# Altium integrated library TI Power Management Battery Management.IntLib: 950 symbols (part 33 of 48) (continued)
## BQ24232RGTTG4 (continued)

## BQ24266RGER
designator U?
IC BATT CHARGER LI-ION 24VQFN; Manufacturer: Texas Instruments; Battery Chemistry: Lithium-Ion; Number of Cells: 1; Current - Charging: Constant - Programmable; Fault Protection: Over Temperature, Over Voltage; Charge Current - Max: 3A; Battery Pack Voltage: 4.2V; Voltage - Supply (Max): 14V; Interface: USB; Supplier 1: Digi-Key; Manufacturer Part Number: BQ24266RGER; RoHS: RoHS Compliant; Category: Integrated Circuits (ICs); Stock 1: 6527; Pricing 1: 1=4.3, 10=3.861, 100=3.1634, 500=2.69294, 1000=2.27115 (USD); Packaging: Cut Tape (CT); Part Status: Active; Programmable Features: -; Operating Temperature: -40°C ~ 85°C (TA); Package / Case: 24-VFQFN Exposed Pad; Supplier Device Package: 24-VQFN (4x4); Base Part Number: BQ24266; ComponentLink1URL: http://www.ti.com/lit/ds/symlink/bq24266.pdf; ComponentLink1Description: http://www.ti.com/lit/ds/symlink/bq24266.pdf; Value: BQ24266RGER; Supplier Part Number 1: 296-39923-1-ND
footprint 24VQFN_4x4 (QFN, 24-Leads, Body 4.00x4.00mm, Pitch 0.50mm, Thermal Pad 2.70x2.70mm, IPC Medium Density)
pins: 1 PMID, 2 BOOT (in), 3 DRV (out), 4 ~{CE} (in), 5 TS (in), 6 SYS (in), 7 SYS (in), 8 BAT, 9 BAT, 10 ~{PG} (out), 11 BGATE (out), 12 ISET (in), 13 ~{CHG} (out), 14 IUSB3 (in), 15 VDPM (in), 16 IUSB2 (in), 17 IUSB1 (in), 18 IN, 19 IN, 20 AGND, 21 PGND, 22 PGND, 23 SW, 24 SW, 25 EPAD

## BQ24300DSGR
designator U?
Charger Front End Protection IC with 30 V Max Vin and 5.5 V LDO Output, 0 to 125 degC, 8-pin WSON (DSG), Green (RoHS & no Sb/Br); PartNumber: BQ24300DSGR; Manufacturer: Texas Instruments; Lead Acid: N; DatasheetVersion: SLUS764C; PackageVersion: revB, Oct-2010; PackageReference: DSG8-1600X900TP; PackageDescription: 8-Pin Plastic Small Outline No-Lead, 2 x 2 x 0.8 mm Body, 0.5 mm Pitch, Exposed Pad; Supplier 1: Digi-Key; Supplier Part Number 1: 296-23075-2-ND; Supplier Part Number 3: 296-23075-6-ND; Eco-Plan: Green (RoHS & no Sb/Br); Li-Ion: N; Li-Polymer: N; NiCd: N; NiMH: N; Over Voltage Protection: N; SubFamily: Charger Front End Protection; Mounting Technology: Surface Mount; Code_JEDEC: MO-229; ComponentLink1Description: Datasheet; ComponentLink1URL: http://www.ti.com/general/docs/lit/getliterature.tsp?genericPartNumber=BQ24300&fileType=pdf
footprint DSG8-1600X900TP (SON, 8-Leads, Body 2x2mm, Pitch 0.5mm, Thermal Pad 1.6x0.9mm, TI Recommended)
pins: 1 IN (power) "Input power, connect to external DC supply. Connect external 0.1uF (minimum) ceramic capacitor to VSS", 2 VSS (power) "Ground terminal", 3 PGATE (out) "Gate drive for optional external P-FET", 4 NC "Do not connect to any external circuit. These pins may have internal connections used for test purposes.", 5 ~{CE} (in) "Chip enable input. Active low. When C\E\ = Hi, the input FET is off. Internally pulled down.", 6 VBAT (in) "Battery voltage sense input. Connect to pack positive terminal through a resistor.", 7 NC "Do not connect to any external circuit. These pins may have internal connections used for test purposes.", 8 OUT (power) "Output terminal to the charging system. Connect external 1uF capacitor (minimum) ceramic capacitor to VSS", 9 EP (power) "There is an internal electrical connection between the exposed thermal pad and the VSS pin of the device. The thermal pad must be connected to the same potential as the VSS pin on the printed circuit board. Do not use the (See Datasheet)"

## BQ24300DSGRG4
designator U?
Charger Front End Protection IC with 30 V Max Vin and 5.5 V LDO Output, 0 to 125 degC, 8-pin WSON (DSG), Green (RoHS & no Sb/Br); PartNumber: BQ24300DSGRG4; Manufacturer: Texas Instruments; Lead Acid: N; DatasheetVersion: SLUS764C; PackageVersion: revB, Oct-2010; PackageReference: DSG8-1600X900TP; PackageDescription: 8-Pin Plastic Small Outline No-Lead, 2 x 2 x 0.8 mm Body, 0.5 mm Pitch, Exposed Pad; Supplier 1: Digi-Key; Supplier Part Number 1: BQ24300DSGRG4-ND; Eco-Plan: Green (RoHS & no Sb/Br); Li-Ion: N; Li-Polymer: N; NiCd: N; NiMH: N; Over Voltage Protection: N; SubFamily: Charger Front End Protection; Mounting Technology: Surface Mount; Code_JEDEC: MO-229; ComponentLink1Description: Datasheet; ComponentLink1URL: http://www.ti.com/general/docs/lit/getliterature.tsp?genericPartNumber=BQ24300&fileType=pdf
footprint DSG8-1600X900TP (SON, 8-Leads, Body 2x2mm, Pitch 0.5mm, Thermal Pad 1.6x0.9mm, TI Recommended)
pins: 1 IN (power) "Input power, connect to external DC supply. Connect external 0.1uF (minimum) ceramic capacitor to VSS", 2 VSS (power) "Ground terminal", 3 PGATE (out) "Gate drive for optional external P-FET", 4 NC "Do not connect to any external circuit. These pins may have internal connections used for test purposes.", 5 ~{CE} (in) "Chip enable input. Active low. When C\E\ = Hi, the input FET is off. Internally pulled down.", 6 VBAT (in) "Battery voltage sense input. Connect to pack positive terminal through a resistor.", 7 NC "Do not connect to any external circuit. These pins may have internal connections used for test purposes.", 8 OUT (power) "Output terminal to the charging system. Connect external 1uF capacitor (minimum) ceramic capacitor to VSS", 9 EP (power) "There is an internal electrical connection between the exposed thermal pad and the VSS pin of the device. The thermal pad must be connected to the same potential as the VSS pin on the printed circuit board. Do not use the (See Datasheet)"

## BQ24300DSGT
designator U?
Charger Front End Protection IC with 30 V Max Vin and 5.5 V LDO Output, 0 to 125 degC, 8-pin WSON (DSG), Green (RoHS & no Sb/Br); PartNumber: BQ24300DSGT; Manufacturer: Texas Instruments; Lead Acid: N; DatasheetVersion: SLUS764C; PackageVersion: revB, Oct-2010; PackageReference: DSG8-1600X900TP; PackageDescription: 8-Pin Plastic Small Outline No-Lead, 2 x 2 x 0.8 mm Body, 0.5 mm Pitch, Exposed Pad; Supplier 1: Digi-Key; Supplier Part Number 1: BQ24300DSGT-ND; Eco-Plan: Green (RoHS & no Sb/Br); Li-Ion: N; Li-Polymer: N; NiCd: N; NiMH: N; Over Voltage Protection: N; SubFamily: Charger Front End Protection; Mounting Technology: Surface Mount; Code_JEDEC: MO-229; ComponentLink1Description: Datasheet; ComponentLink1URL: http://www.ti.com/general/docs/lit/getliterature.tsp?genericPartNumber=BQ24300&fileType=pdf
footprint DSG8-1600X900TP (SON, 8-Leads, Body 2x2mm, Pitch 0.5mm, Thermal Pad 1.6x0.9mm, TI Recommended)
pins: 1 IN (power) "Input power, connect to external DC supply. Connect external 0.1uF (minimum) ceramic capacitor to VSS", 2 VSS (power) "Ground terminal", 3 PGATE (out) "Gate drive for optional external P-FET", 4 NC "Do not connect to any external circuit. These pins may have internal connections used for test purposes.", 5 ~{CE} (in) "Chip enable input. Active low. When C\E\ = Hi, the input FET is off. Internally pulled down.", 6 VBAT (in) "Battery voltage sense input. Connect to pack positive terminal through a resistor.", 7 NC "Do not connect to any external circuit. These pins may have internal connections used for test purposes.", 8 OUT (power) "Output terminal to the charging system. Connect external 1uF capacitor (minimum) ceramic capacitor to VSS", 9 EP (power) "There is an internal electrical connection between the exposed thermal pad and the VSS pin of the device. The thermal pad must be connected to the same potential as the VSS pin on the printed circuit board. Do not use the (See Datasheet)"

## BQ24300DSGTG4
designator U?
Charger Front End Protection IC with 30 V Max Vin and 5.5 V LDO Output, 0 to 125 degC, 8-pin WSON (DSG), Green (RoHS & no Sb/Br); PartNumber: BQ24300DSGTG4; Manufacturer: Texas Instruments; Lead Acid: N; DatasheetVersion: SLUS764C; PackageVersion: revB, Oct-2010; PackageReference: DSG8-1600X900TP; PackageDescription: 8-Pin Plastic Small Outline No-Lead, 2 x 2 x 0.8 mm Body, 0.5 mm Pitch, Exposed Pad; Supplier 1: Digi-Key; Supplier Part Number 1: BQ24300DSGTG4-ND; Eco-Plan: Green (RoHS & no Sb/Br); Li-Ion: N; Li-Polymer: N; NiCd: N; NiMH: N; Over Voltage Protection: N; SubFamily: Charger Front End Protection; Mounting Technology: Surface Mount; Code_JEDEC: MO-229; ComponentLink1Description: Datasheet; ComponentLink1URL: http://www.ti.com/general/docs/lit/getliterature.tsp?genericPartNumber=BQ24300&fileType=pdf
footprint DSG8-1600X900TP (SON, 8-Leads, Body 2x2mm, Pitch 0.5mm, Thermal Pad 1.6x0.9mm, TI Recommended)
pins: 1 IN (power) "Input power, connect to external DC supply. Connect external 0.1uF (minimum) ceramic capacitor to VSS", 2 VSS (power) "Ground terminal", 3 PGATE (out) "Gate drive for optional external P-FET", 4 NC "Do not connect to any external circuit. These pins may have internal connections used for test purposes.", 5 ~{CE} (in) "Chip enable input. Active low. When C\E\ = Hi, the input FET is off. Internally pulled down.", 6 VBAT (in) "Battery voltage sense input. Connect to pack positive terminal through a resistor.", 7 NC "Do not connect to any external circuit. These pins may have internal connections used for test purposes.", 8 OUT (power) "Output terminal to the charging system. Connect external 1uF capacitor (minimum) ceramic capacitor to VSS", 9 EP (power) "There is an internal electrical connection between the exposed thermal pad and the VSS pin of the device. The thermal pad must be connected to the same potential as the VSS pin on the printed circuit board. Do not use the (See Datasheet)"

## BQ24304DSGR
designator U?
Charger Front End Protection IC with 30 V Max Vin and 4.5 V LDO Output, 0 to 125 degC, 8-pin WSON (DSG), Green (RoHS & no Sb/Br); PartNumber: BQ24304DSGR; Manufacturer: Texas Instruments; Lead Acid: N; DatasheetVersion: SLUS764C; PackageVersion: revB, Oct-2010; PackageReference: DSG8-1600X900TP; PackageDescription: 8-Pin Plastic Small Outline No-Lead, 2 x 2 x 0.8 mm Body, 0.5 mm Pitch, Exposed Pad; Supplier 1: Digi-Key; Supplier Part Number 1: 296-23076-2-ND; Supplier Part Number 3: 296-23076-6-ND; Eco-Plan: Green (RoHS & no Sb/Br); Li-Ion: N; Li-Polymer: N; NiCd: N; NiMH: N; Over Voltage Protection: N; SubFamily: Charger Front End Protection; Mounting Technology: Surface Mount; Code_JEDEC: MO-229; ComponentLink1Description: Datasheet; ComponentLink1URL: http://www.ti.com/general/docs/lit/getliterature.tsp?genericPartNumber=BQ24304&fileType=pdf
footprint DSG8-1600X900TP (SON, 8-Leads, Body 2x2mm, Pitch 0.5mm, Thermal Pad 1.6x0.9mm, TI Recommended)
pins: 1 IN (power) "Input power, connect to external DC supply. Connect external 0.1uF (minimum) ceramic capacitor to VSS", 2 VSS (power) "Ground terminal", 3 PGATE (out) "Gate drive for optional external P-FET", 4 NC "Do not connect to any external circuit. These pins may have internal connections used for test purposes.", 5 ~{CE} (in) "Chip enable input. Active low. When C\E\ = Hi, the input FET is off. Internally pulled down.", 6 VBAT (in) "Battery voltage sense input. Connect to pack positive terminal through a resistor.", 7 NC "Do not connect to any external circuit. These pins may have internal connections used for test purposes.", 8 OUT (power) "Output terminal to the charging system. Connect external 1uF capacitor (minimum) ceramic capacitor to VSS", 9 EP (power) "There is an internal electrical connection between the exposed thermal pad and the VSS pin of the device. The thermal pad must be connected to the same potential as the VSS pin on the printed circuit board. Do not use the (See Datasheet)"

## BQ24304DSGRG4
designator U?
Charger Front End Protection IC with 30 V Max Vin and 4.5 V LDO Output, 0 to 125 degC, 8-pin WSON (DSG), Green (RoHS & no Sb/Br); PartNumber: BQ24304DSGRG4; Manufacturer: Texas Instruments; Lead Acid: N; DatasheetVersion: SLUS764C; PackageVersion: revB, Oct-2010; PackageReference: DSG8-1600X900TP; PackageDescription: 8-Pin Plastic Small Outline No-Lead, 2 x 2 x 0.8 mm Body, 0.5 mm Pitch, Exposed Pad; Supplier 1: Digi-Key; Supplier Part Number 1: BQ24304DSGRG4-ND; Eco-Plan: Green (RoHS & no Sb/Br); Li-Ion: N; Li-Polymer: N; NiCd: N; NiMH: N; Over Voltage Protection: N; SubFamily: Charger Front End Protection; Mounting Technology: Surface Mount; Code_JEDEC: MO-229; ComponentLink1Description: Datasheet; ComponentLink1URL: http://www.ti.com/general/docs/lit/getliterature.tsp?genericPartNumber=BQ24304&fileType=pdf
footprint DSG8-1600X900TP (SON, 8-Leads, Body 2x2mm, Pitch 0.5mm, Thermal Pad 1.6x0.9mm, TI Recommended)
pins: 1 IN (power) "Input power, connect to external DC supply. Connect external 0.1uF (minimum) ceramic capacitor to VSS", 2 VSS (power) "Ground terminal", 3 PGATE (out) "Gate drive for optional external P-FET", 4 NC "Do not connect to any external circuit. These pins may have internal connections used for test purposes.", 5 ~{CE} (in) "Chip enable input. Active low. When C\E\ = Hi, the input FET is off. Internally pulled down.", 6 VBAT (in) "Battery voltage sense input. Connect to pack positive terminal through a resistor.", 7 NC "Do not connect to any external circuit. These pins may have internal connections used for test purposes.", 8 OUT (power) "Output terminal to the charging system. Connect external 1uF capacitor (minimum) ceramic capacitor to VSS", 9 EP (power) "There is an internal electrical connection between the exposed thermal pad and the VSS pin of the device. The thermal pad must be connected to the same potential as the VSS pin on the printed circuit board. Do not use the (See Datasheet)"

## BQ24304DSGT
designator U?
Charger Front End Protection IC with 30 V Max Vin and 4.5 V LDO Output, 0 to 125 degC, 8-pin WSON (DSG), Green (RoHS & no Sb/Br); PartNumber: BQ24304DSGT; Manufacturer: Texas Instruments; Lead Acid: N; DatasheetVersion: SLUS764C; PackageVersion: revB, Oct-2010; PackageReference: DSG8-1600X900TP; PackageDescription: 8-Pin Plastic Small Outline No-Lead, 2 x 2 x 0.8 mm Body, 0.5 mm Pitch, Exposed Pad; Supplier 1: Digi-Key; Supplier Part Number 1: BQ24304DSGT-ND; Eco-Plan: Green (RoHS & no Sb/Br); Li-Ion: N; Li-Polymer: N; NiCd: N; NiMH: N; Over Voltage Protection: N; SubFamily: Charger Front End Protection; Mounting Technology: Surface Mount; Code_JEDEC: MO-229; ComponentLink1Description: Datasheet; ComponentLink1URL: http://www.ti.com/general/docs/lit/getliterature.tsp?genericPartNumber=BQ24304&fileType=pdf
footprint DSG8-1600X900TP (SON, 8-Leads, Body 2x2mm, Pitch 0.5mm, Thermal Pad 1.6x0.9mm, TI Recommended)
pins: 1 IN (power) "Input power, connect to external DC supply. Connect external 0.1uF (minimum) ceramic capacitor to VSS", 2 VSS (power) "Ground terminal", 3 PGATE (out) "Gate drive for optional external P-FET", 4 NC "Do not connect to any external circuit. These pins may have internal connections used for test purposes.", 5 ~{CE} (in) "Chip enable input. Active low. When C\E\ = Hi, the input FET is off. Internally pulled down.", 6 VBAT (in) "Battery voltage sense input. Connect to pack positive terminal through a resistor.", 7 NC "Do not connect to any external circuit. These pins may have internal connections used for test purposes.", 8 OUT (power) "Output terminal to the charging system. Connect external 1uF capacitor (minimum) ceramic capacitor to VSS", 9 EP (power) "There is an internal electrical connection between the exposed thermal pad and the VSS pin of the device. The thermal pad must be connected to the same potential as the VSS pin on the printed circuit board. Do not use the (See Datasheet)"

## BQ24304DSGTG4
designator U?
Charger Front End Protection IC with 30 V Max Vin and 4.5 V LDO Output, 0 to 125 degC, 8-pin WSON (DSG), Green (RoHS & no Sb/Br); PartNumber: BQ24304DSGTG4; Manufacturer: Texas Instruments; Lead Acid: N; DatasheetVersion: SLUS764C; PackageVersion: revB, Oct-2010; PackageReference: DSG8-1600X900TP; PackageDescription: 8-Pin Plastic Small Outline No-Lead, 2 x 2 x 0.8 mm Body, 0.5 mm Pitch, Exposed Pad; Supplier 1: Digi-Key; Supplier Part Number 1: BQ24304DSGTG4-ND; Eco-Plan: Green (RoHS & no Sb/Br); Li-Ion: N; Li-Polymer: N; NiCd: N; NiMH: N; Over Voltage Protection: N; SubFamily: Charger Front End Protection; Mounting Technology: Surface Mount; Code_JEDEC: MO-229; ComponentLink1Description: Datasheet; ComponentLink1URL: http://www.ti.com/general/docs/lit/getliterature.tsp?genericPartNumber=BQ24304&fileType=pdf
footprint DSG8-1600X900TP (SON, 8-Leads, Body 2x2mm, Pitch 0.5mm, Thermal Pad 1.6x0.9mm, TI Recommended)
pins: 1 IN (power) "Input power, connect to external DC supply. Connect external 0.1uF (minimum) ceramic capacitor to VSS", 2 VSS (power) "Ground terminal", 3 PGATE (out) "Gate drive for optional external P-FET", 4 NC "Do not connect to any external circuit. These pins may have internal connections used for test purposes.", 5 ~{CE} (in) "Chip enable input. Active low. When C\E\ = Hi, the input FET is off. Internally pulled down.", 6 VBAT (in) "Battery voltage sense input. Connect to pack positive terminal through a resistor.", 7 NC "Do not connect to any external circuit. These pins may have internal connections used for test purposes.", 8 OUT (power) "Output terminal to the charging system. Connect external 1uF capacitor (minimum) ceramic capacitor to VSS", 9 EP (power) "There is an internal electrical connection between the exposed thermal pad and the VSS pin of the device. The thermal pad must be connected to the same potential as the VSS pin on the printed circuit board. Do not use the (See Datasheet)"

## BQ24305DSGR
designator U?
Overvoltage and Overcurrent Protection IC and Li+ Charger Front End Protection IC, 0 to 125 degC, 8-pin WSON (DSG), Green (RoHS & no Sb/Br); PartNumber: BQ24305DSGR; Manufacturer: Texas Instruments; Lead Acid: N; DatasheetVersion: SLUS764C; PackageVersion: revB, Oct-2010; PackageReference: DSG8-1600X900TP; PackageDescription: 8-Pin Plastic Small Outline No-Lead, 2 x 2 x 0.8 mm Body, 0.5 mm Pitch, Exposed Pad; Supplier 1: Digi-Key; Supplier Part Number 1: BQ24305DSGR-ND; Eco-Plan: Green (RoHS & no Sb/Br); Li-Ion: N; Li-Polymer: N; NiCd: N; NiMH: N; Over Voltage Protection: N; SubFamily: Charger Front End Protection; Mounting Technology: Surface Mount; Code_JEDEC: MO-229; ComponentLink1Description: Datasheet; ComponentLink1URL: http://www.ti.com/general/docs/lit/getliterature.tsp?genericPartNumber=BQ24305&fileType=pdf
footprint DSG8-1600X900TP (SON, 8-Leads, Body 2x2mm, Pitch 0.5mm, Thermal Pad 1.6x0.9mm, TI Recommended)
pins: 1 IN (power) "Input power, connect to external DC supply. Connect external 0.1uF (minimum) ceramic capacitor to VSS", 2 VSS (power) "Ground terminal", 3 PGATE (out) "Gate drive for optional external P-FET", 4 NC "Do not connect to any external circuit. These pins may have internal connections used for test purposes.", 5 ~{CE} (in) "Chip enable input. Active low. When C\E\ = Hi, the input FET is off. Internally pulled down.", 6 VBAT (in) "Battery voltage sense input. Connect to pack positive terminal through a resistor.", 7 NC "Do not connect to any external circuit. These pins may have internal connections used for test purposes.", 8 OUT (power) "Output terminal to the charging system. Connect external 1uF capacitor (minimum) ceramic capacitor to VSS", 9 EP (power) "There is an internal electrical connection between the exposed thermal pad and the VSS pin of the device. The thermal pad must be connected to the same potential as the VSS pin on the printed circuit board. Do not use the (See Datasheet)"

## BQ24305DSGRG4
designator U?
Overvoltage and Overcurrent Protection IC and Li+ Charger Front End Protection IC, 0 to 125 degC, 8-pin WSON (DSG), Green (RoHS & no Sb/Br); PartNumber: BQ24305DSGRG4; Manufacturer: Texas Instruments; Lead Acid: N; DatasheetVersion: SLUS764C; PackageVersion: revB, Oct-2010; PackageReference: DSG8-1600X900TP; PackageDescription: 8-Pin Plastic Small Outline No-Lead, 2 x 2 x 0.8 mm Body, 0.5 mm Pitch, Exposed Pad; Supplier 1: Digi-Key; Supplier Part Number 1: BQ24305DSGRG4-ND; Eco-Plan: Green (RoHS & no Sb/Br); Li-Ion: N; Li-Polymer: N; NiCd: N; NiMH: N; Over Voltage Protection: N; SubFamily: Charger Front End Protection; Mounting Technology: Surface Mount; Code_JEDEC: MO-229; ComponentLink1Description: Datasheet; ComponentLink1URL: http://www.ti.com/general/docs/lit/getliterature.tsp?genericPartNumber=BQ24305&fileType=pdf
footprint DSG8-1600X900TP (SON, 8-Leads, Body 2x2mm, Pitch 0.5mm, Thermal Pad 1.6x0.9mm, TI Recommended)
pins: 1 IN (power) "Input power, connect to external DC supply. Connect external 0.1uF (minimum) ceramic capacitor to VSS", 2 VSS (power) "Ground terminal", 3 PGATE (out) "Gate drive for optional external P-FET", 4 NC "Do not connect to any external circuit. These pins may have internal connections used for test purposes.", 5 ~{CE} (in) "Chip enable input. Active low. When C\E\ = Hi, the input FET is off. Internally pulled down.", 6 VBAT (in) "Battery voltage sense input. Connect to pack positive terminal through a resistor.", 7 NC "Do not connect to any external circuit. These pins may have internal connections used for test purposes.", 8 OUT (power) "Output terminal to the charging system. Connect external 1uF capacitor (minimum) ceramic capacitor to VSS", 9 EP (power) "There is an internal electrical connection between the exposed thermal pad and the VSS pin of the device. The thermal pad must be connected to the same potential as the VSS pin on the printed circuit board. Do not use the (See Datasheet)"

## BQ24305DSGT
designator U?
Overvoltage and Overcurrent Protection IC and Li+ Charger Front End Protection IC, 0 to 125 degC, 8-pin WSON (DSG), Green (RoHS & no Sb/Br); PartNumber: BQ24305DSGT; Manufacturer: Texas Instruments; Lead Acid: N; DatasheetVersion: SLUS764C; PackageVersion: revB, Oct-2010; PackageReference: DSG8-1600X900TP; PackageDescription: 8-Pin Plastic Small Outline No-Lead, 2 x 2 x 0.8 mm Body, 0.5 mm Pitch, Exposed Pad; Supplier 1: Digi-Key; Supplier Part Number 1: 296-23518-2-ND; Supplier Part Number 3: 296-23518-6-ND; Eco-Plan: Green (RoHS & no Sb/Br); Li-Ion: N; Li-Polymer: N; NiCd: N; NiMH: N; Over Voltage Protection: N; SubFamily: Charger Front End Protection; Mounting Technology: Surface Mount; Code_JEDEC: MO-229; ComponentLink1Description: Datasheet; ComponentLink1URL: http://www.ti.com/general/docs/lit/getliterature.tsp?genericPartNumber=BQ24305&fileType=pdf
footprint DSG8-1600X900TP (SON, 8-Leads, Body 2x2mm, Pitch 0.5mm, Thermal Pad 1.6x0.9mm, TI Recommended)
pins: 1 IN (power) "Input power, connect to external DC supply. Connect external 0.1uF (minimum) ceramic capacitor to VSS", 2 VSS (power) "Ground terminal", 3 PGATE (out) "Gate drive for optional external P-FET", 4 NC "Do not connect to any external circuit. These pins may have internal connections used for test purposes.", 5 ~{CE} (in) "Chip enable input. Active low. When C\E\ = Hi, the input FET is off. Internally pulled down.", 6 VBAT (in) "Battery voltage sense input. Connect to pack positive terminal through a resistor.", 7 NC "Do not connect to any external circuit. These pins may have internal connections used for test purposes.", 8 OUT (power) "Output terminal to the charging system. Connect external 1uF capacitor (minimum) ceramic capacitor to VSS", 9 EP (power) "There is an internal electrical connection between the exposed thermal pad and the VSS pin of the device. The thermal pad must be connected to the same potential as the VSS pin on the printed circuit board. Do not use the (See Datasheet)"

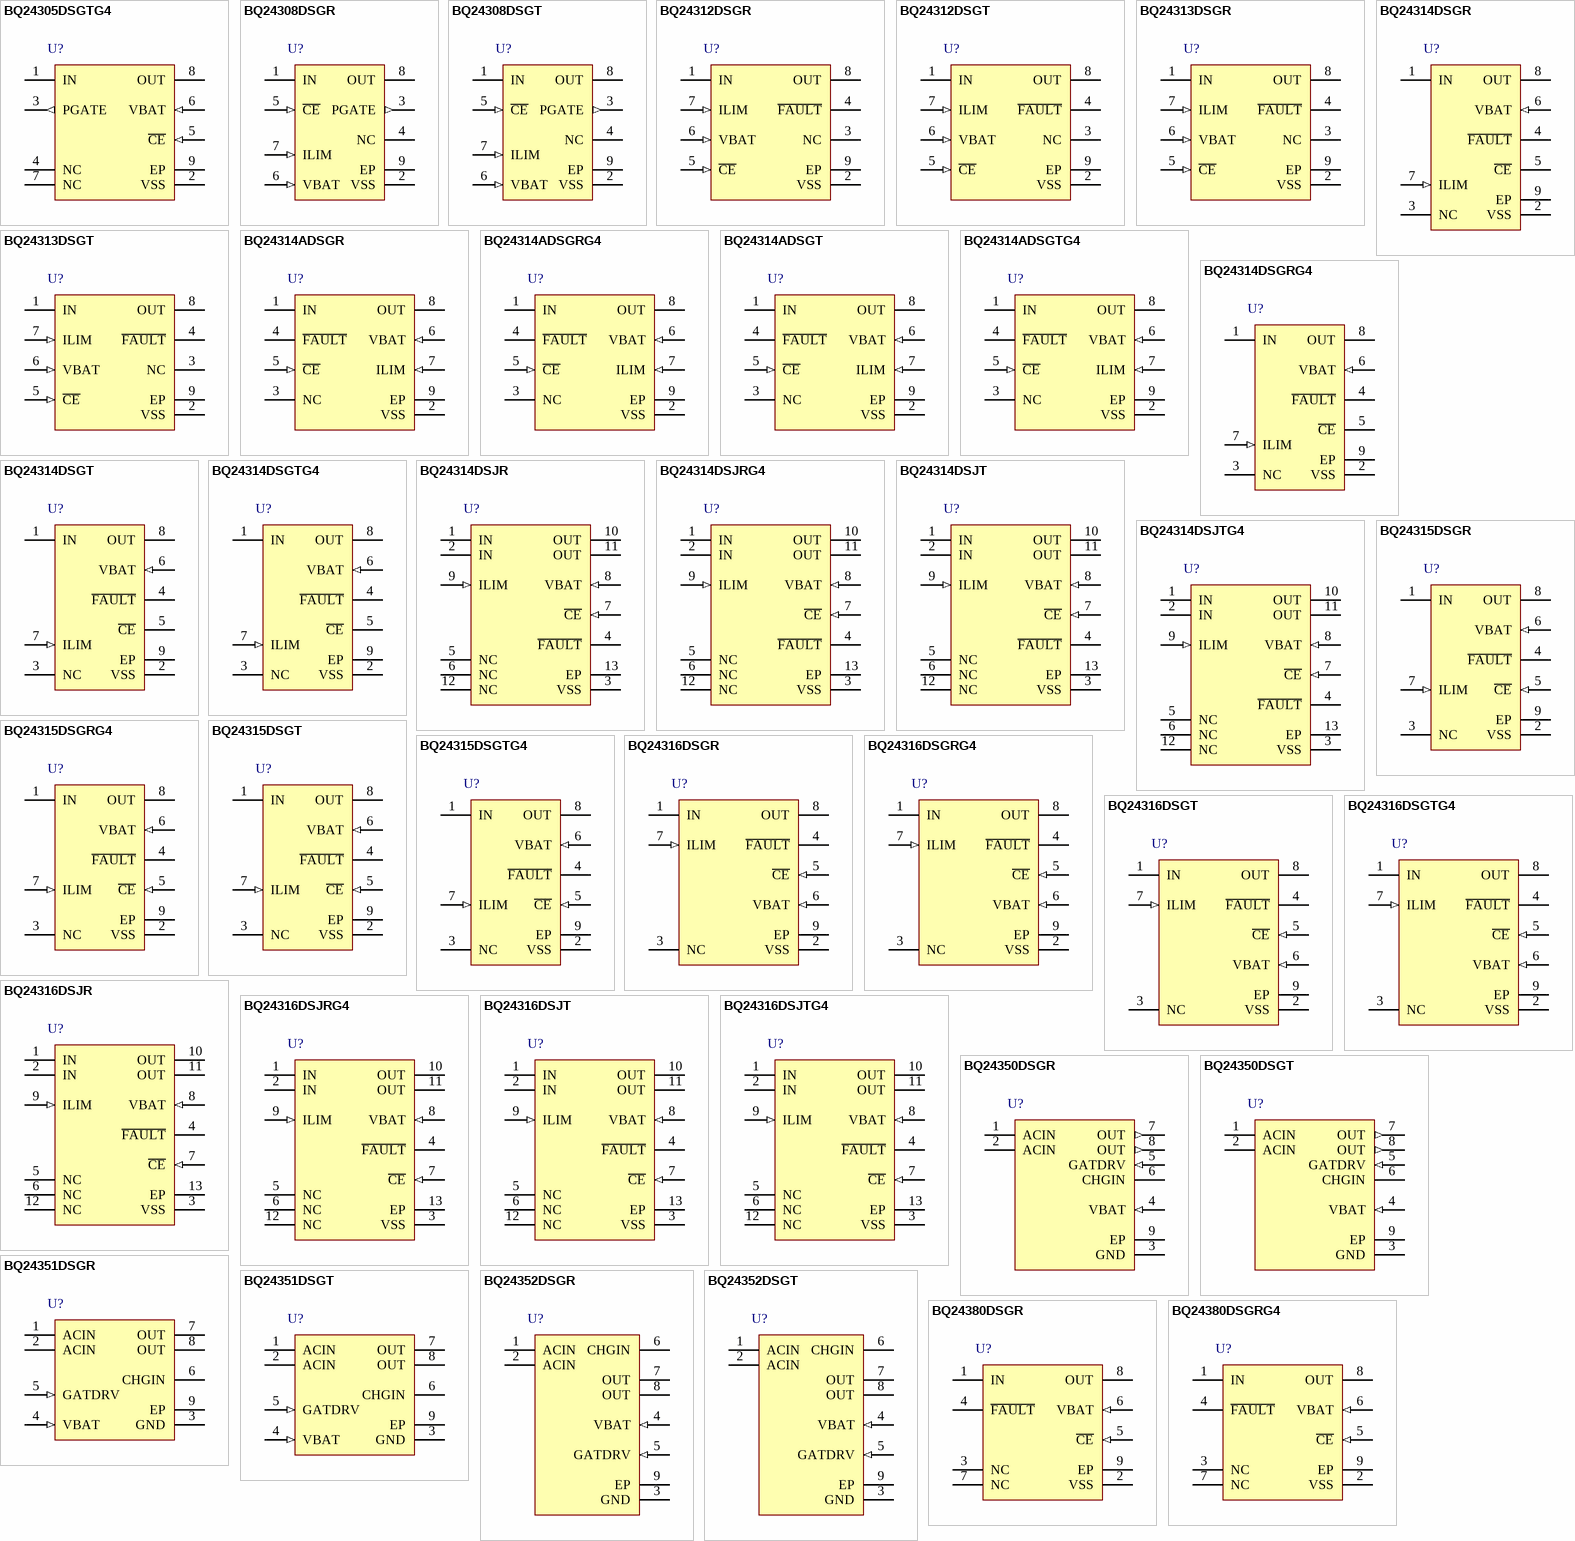
[diagram p23: symbols BQ24305DSGTG4 to BQ24380DSGRG4]

## BQ24305DSGTG4
designator U?
Overvoltage and Overcurrent Protection IC and Li+ Charger Front End Protection IC, 0 to 125 degC, 8-pin WSON (DSG), Green (RoHS & no Sb/Br); PartNumber: BQ24305DSGTG4; Manufacturer: Texas Instruments; Lead Acid: N; DatasheetVersion: SLUS764C; PackageVersion: revB, Oct-2010; PackageReference: DSG8-1600X900TP; PackageDescription: 8-Pin Plastic Small Outline No-Lead, 2 x 2 x 0.8 mm Body, 0.5 mm Pitch, Exposed Pad; Supplier 1: Digi-Key; Supplier Part Number 1: BQ24305DSGTG4-ND; Eco-Plan: Green (RoHS & no Sb/Br); Li-Ion: N; Li-Polymer: N; NiCd: N; NiMH: N; Over Voltage Protection: N; SubFamily: Charger Front End Protection; Mounting Technology: Surface Mount; Code_JEDEC: MO-229; ComponentLink1Description: Datasheet; ComponentLink1URL: http://www.ti.com/general/docs/lit/getliterature.tsp?genericPartNumber=BQ24305&fileType=pdf
footprint DSG8-1600X900TP (SON, 8-Leads, Body 2x2mm, Pitch 0.5mm, Thermal Pad 1.6x0.9mm, TI Recommended)
pins: 1 IN (power) "Input power, connect to external DC supply. Connect external 0.1uF (minimum) ceramic capacitor to VSS", 2 VSS (power) "Ground terminal", 3 PGATE (out) "Gate drive for optional external P-FET", 4 NC "Do not connect to any external circuit. These pins may have internal connections used for test purposes.", 5 ~{CE} (in) "Chip enable input. Active low. When C\E\ = Hi, the input FET is off. Internally pulled down.", 6 VBAT (in) "Battery voltage sense input. Connect to pack positive terminal through a resistor.", 7 NC "Do not connect to any external circuit. These pins may have internal connections used for test purposes.", 8 OUT (power) "Output terminal to the charging system. Connect external 1uF capacitor (minimum) ceramic capacitor to VSS", 9 EP (power) "There is an internal electrical connection between the exposed thermal pad and the VSS pin of the device. The thermal pad must be connected to the same potential as the VSS pin on the printed circuit board. Do not use the (See Datasheet)"

## BQ24308DSGR
designator U?
Overvoltage and Overcurrent Protection IC, 0 to 125 degC, 8-pin WSON (DSG), Green (RoHS & no Sb/Br); PartNumber: BQ24308DSGR; Manufacturer: Texas Instruments; Lead Acid: N; SubFamily: Charger Front End Protection; DatasheetVersion: SLUS977A; PackageVersion: revB, Oct-2010; PackageReference: DSG8-1600X900TP; PackageDescription: 8-Pin Plastic Small Outline No-Lead, 2 x 2 x 0.8 mm Body, 0.5 mm Pitch, Exposed Pad; Supplier 1: Digi-Key; Supplier Part Number 1: BQ24308DSGR-ND; Eco-Plan: Green (RoHS & no Sb/Br); Li-Ion: N; Li-Polymer: N; NiCd: N; NiMH: N; Over Voltage Protection: N; Mounting Technology: Surface Mount; Code_JEDEC: MO-229; ComponentLink1Description: Datasheet; ComponentLink1URL: http://www.ti.com/general/docs/lit/getliterature.tsp?genericPartNumber=BQ24308&fileType=pdf
footprint DSG8-1600X900TP (SON, 8-Leads, Body 2x2mm, Pitch 0.5mm, Thermal Pad 1.6x0.9mm, TI Recommended)
pins: 1 IN (power) "Input power, connect to external DC supply. Connect external 0.1uF (minimum) ceramic capacitor to VSS", 2 VSS (power) "Ground terminal", 3 PGATE (out) "Gate drive for optional external P-FET", 4 NC "Do not connect to any external circuit. This pin may have internal connections used for test purpose.", 5 ~{CE} (in) "Chip enable input. Active low. When C\E\= High, the input FET is off. Internally pulled down.", 6 VBAT (in) "Battery voltage sense input. Connect to pack positive terminal through a resistor.", 7 ILIM (in) "Input over-current threshold programming. An optional external resistor can be used to increase input over-current threshold. Connect a resistor to VSS to increase the OCP threshold.", 8 OUT (power) "Output terminal to the charging system. Connect external 1uF capacitor (minimum) ceramic capacitor to VSS", 9 EP (power) "There is an internal electrical connection between the exposed thermal pad and the VSS pin of the device.The thermal pad must be connected to the same potential as the VSS pin on the printed circuit board. Do not use the (See Datasheet)"